# Altium schematic symbol library AliPadash.SchLib: 1186 symbols (part 2 of 6)
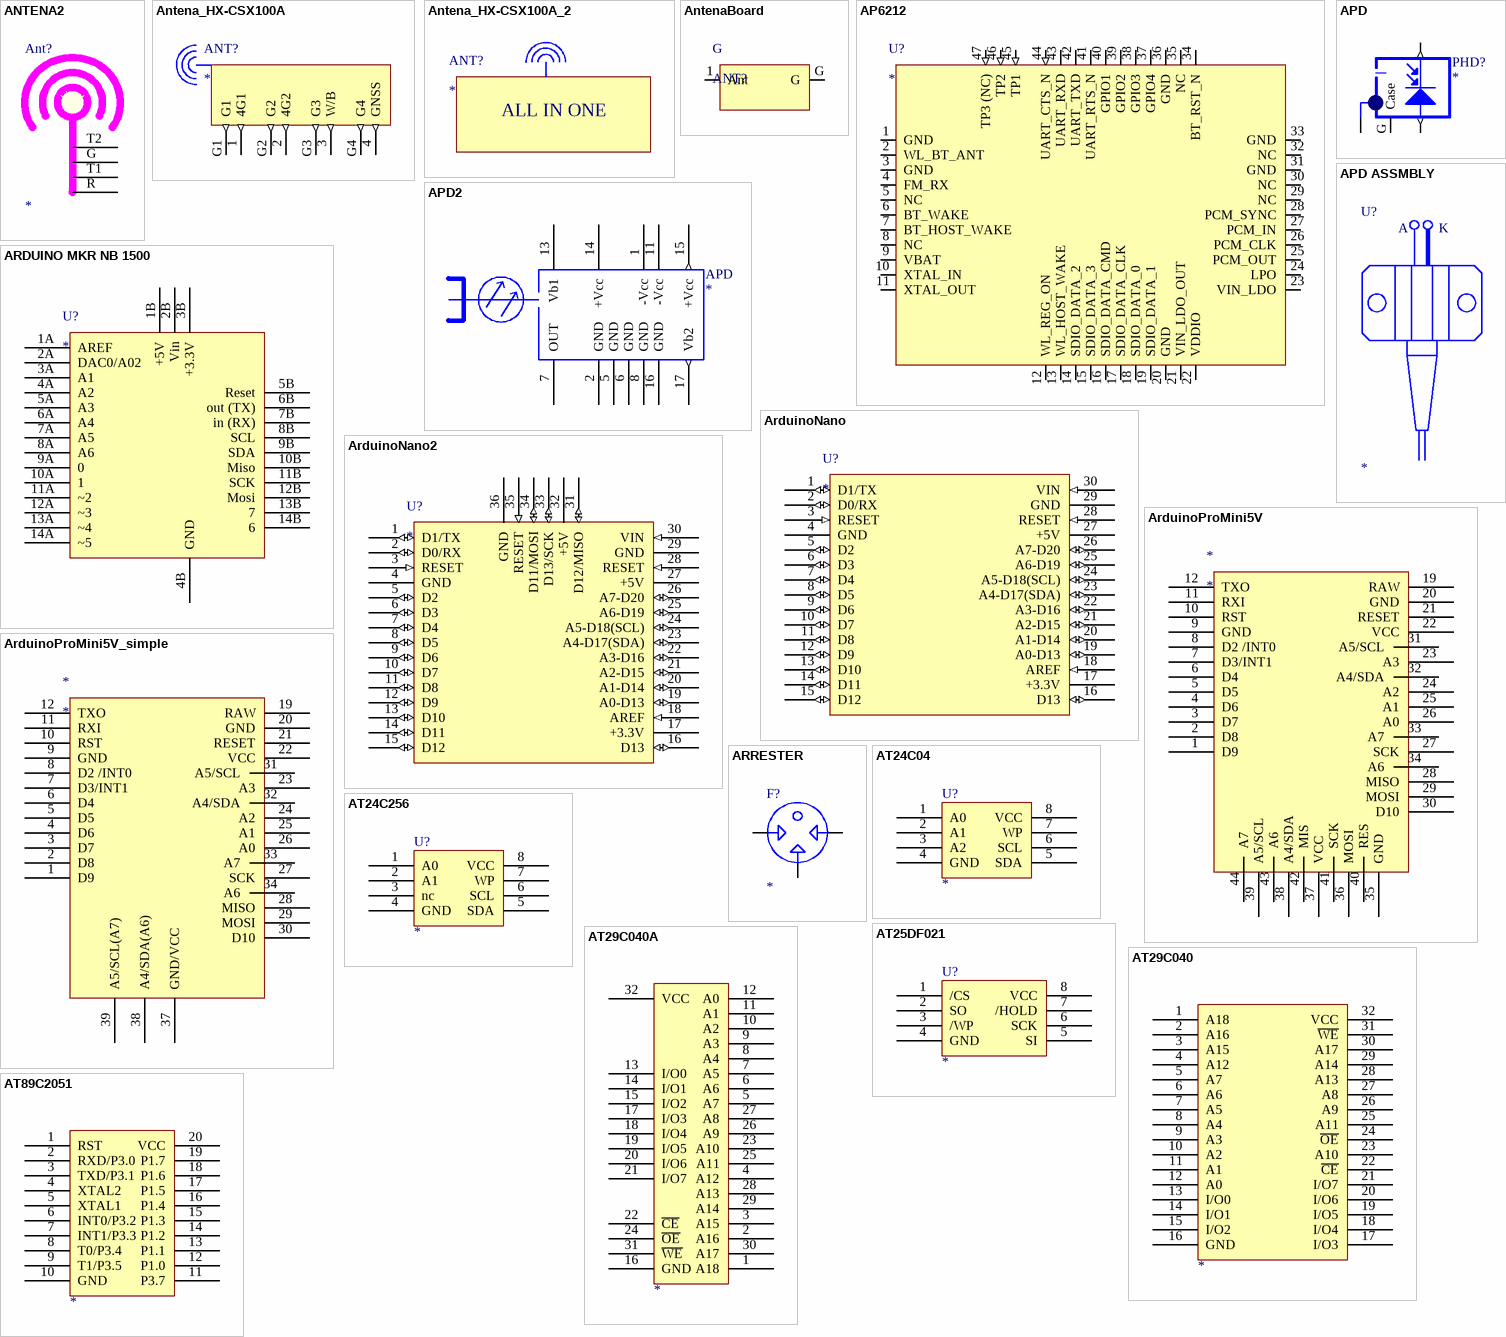
[diagram p87: symbols ANTENA2 to AT89C2051]

## AT29C040A
designator ?
pins: 1 A18, 2 A16, 3 A15, 4 A12, 5 A7, 6 A6, 7 A5, 8 A4, 9 A3, 10 A2, 11 A1, 12 A0, 13 I/O0, 14 I/O1, 15 I/O2, 16 GND, 17 I/O3, 18 I/O4, 19 I/O5, 20 I/O6, 21 I/O7, 22 ~{CE}, 23 A10, 24 ~{OE}, 25 A11, 26 A9, 27 A8, 28 A13, 29 A14, 30 A17, 31 ~{WE}, 32 VCC

## AT89C2051
designator ?
pins: 1 RST, 2 RXD/P3.0, 3 TXD/P3.1, 4 XTAL2, 5 XTAL1, 6 INT0/P3.2, 7 INT1/P3.3, 8 T0/P3.4, 9 T1/P3.5, 10 GND, 11 P3.7, 12 P1.0, 13 P1.1, 14 P1.2, 15 P1.3, 16 P1.4, 17 P1.5, 18 P1.6, 19 P1.7, 20 VCC

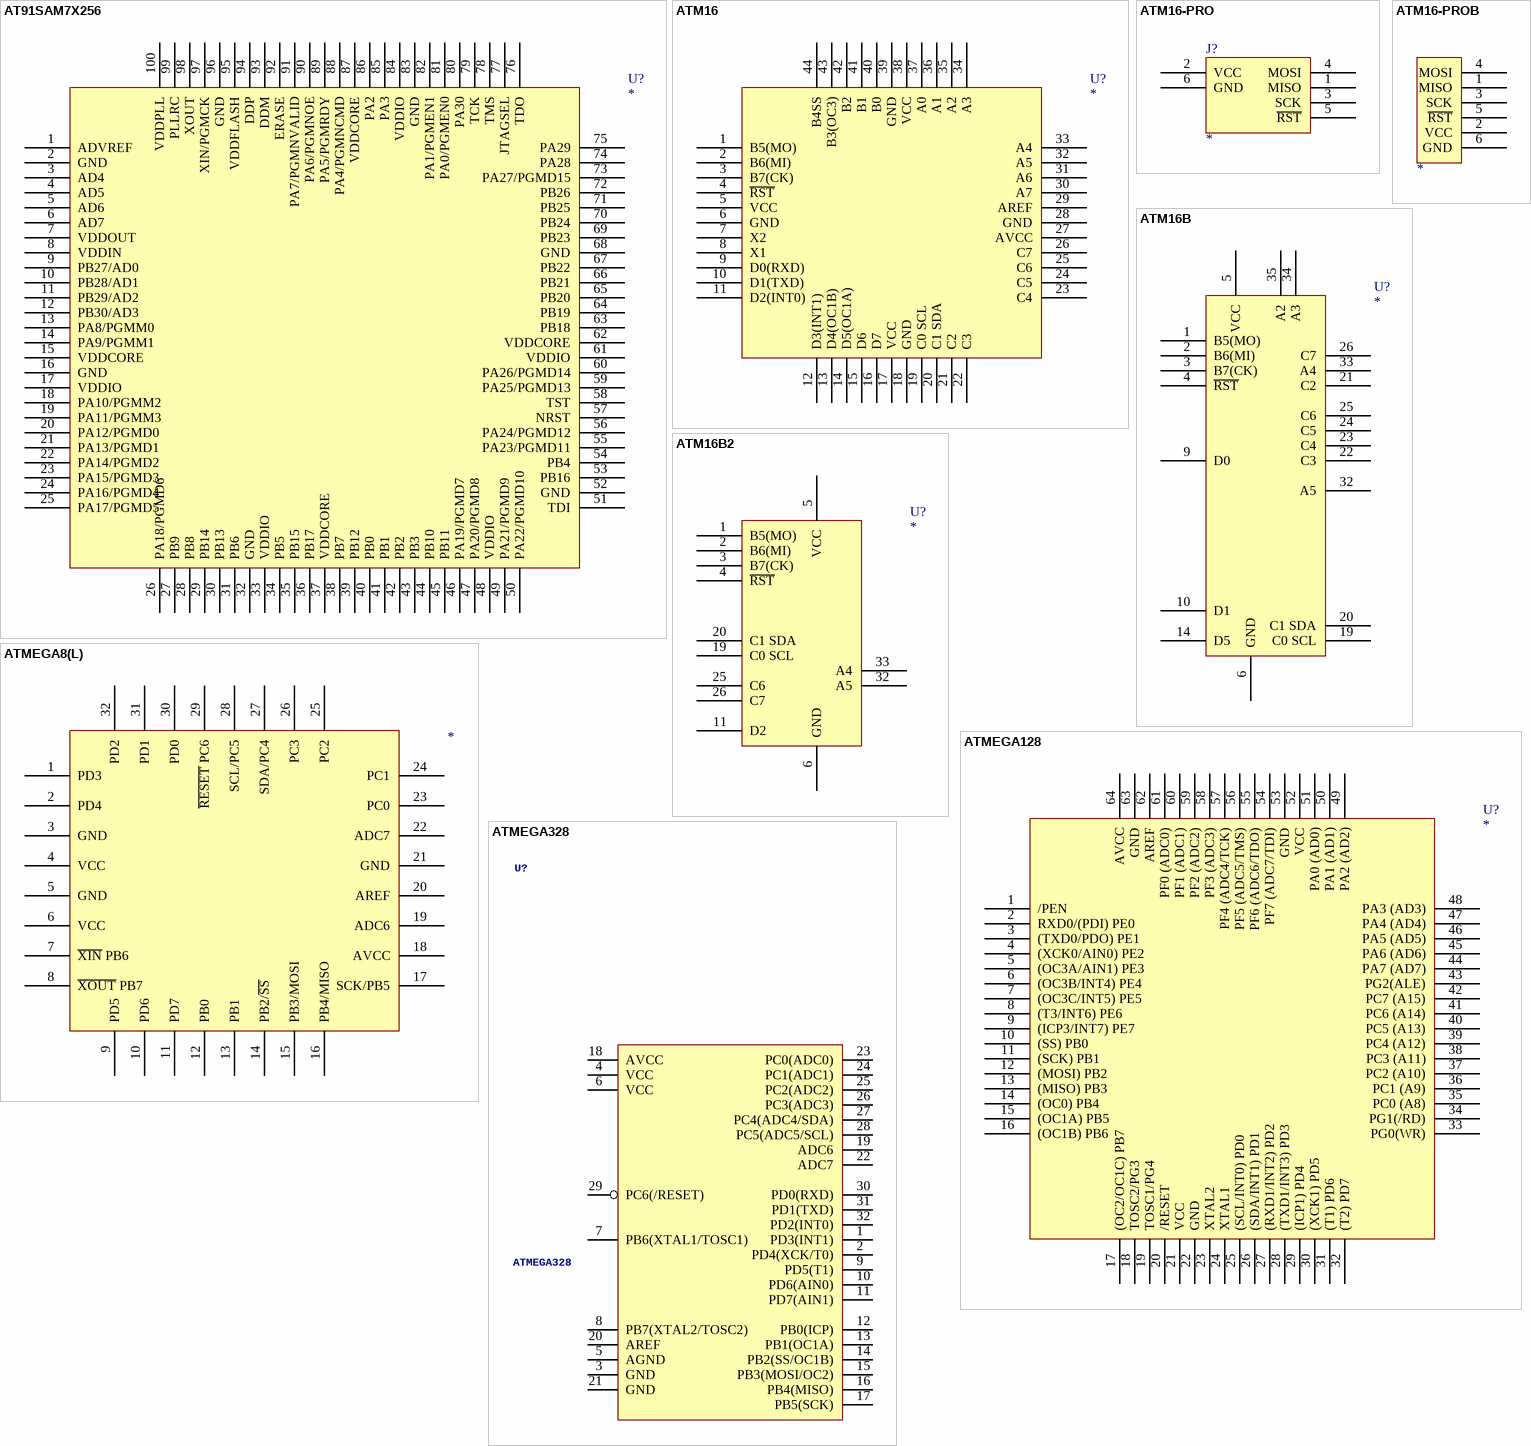
[diagram p15: symbols AT91SAM7X256 to ATMEGA328]

## AT91SAM7X256
designator U?
pins: 1 ADVREF, 2 GND, 3 AD4, 4 AD5, 5 AD6, 6 AD7, 7 VDDOUT, 8 VDDIN, 9 PB27/AD0, 10 PB28/AD1, 11 PB29/AD2, 12 PB30/AD3, 13 PA8/PGMM0, 14 PA9/PGMM1, 15 VDDCORE, 16 GND, 17 VDDIO, 18 PA10/PGMM2, 19 PA11/PGMM3, 20 PA12/PGMD0, 21 PA13/PGMD1, 22 PA14/PGMD2, 23 PA15/PGMD3, 24 PA16/PGMD4, 25 PA17/PGMD5, 26 PA18/PGMD6, 27 PB9, 28 PB8, 29 PB14, 30 PB13, 31 PB6, 32 GND, 33 VDDIO, 34 PB5, 35 PB15, 36 PB17, 37 VDDCORE, 38 PB7, 39 PB12, 40 PB0, 41 PB1, 42 PB2, 43 PB3, 44 PB10, 45 PB11, 46 PA19/PGMD7, 47 PA20/PGMD8, 48 VDDIO, 49 PA21/PGMD9, 50 PA22/PGMD10, 51 TDI, 52 GND, 53 PB16, 54 PB4, 55 PA23/PGMD11, 56 PA24/PGMD12, 57 NRST, 58 TST, 59 PA25/PGMD13, 60 PA26/PGMD14, 61 VDDIO, 62 VDDCORE, 63 PB18, 64 PB19, 65 PB20, 66 PB21, 67 PB22, 68 GND, 69 PB23, 70 PB24, 71 PB25, 72 PB26, 73 PA27/PGMD15, 74 PA28, 75 PA29, 76 TDO, 77 JTAGSEL, 78 TMS, 79 TCK, 80 PA30, 81 PA0/PGMEN0, 82 PA1/PGMEN1, 83 GND, 84 VDDIO, 85 PA3, 86 PA2, 87 VDDCORE, 88 PA4/PGMNCMD, 89 PA5/PGMRDY, 90 PA6/PGMNOE, 91 PA7/PGMNVALID, 92 ERASE, 93 DDM, 94 DDP, 95 VDDFLASH, 96 GND, 97 XIN/PGMCK, 98 XOUT, 99 PLLRC, 100 VDDPLL

## ATM16
designator U?
footprint TQFP44
pins: 1 B5(MO), 2 B6(MI), 3 B7(CK), 4 ~{RST}, 5 VCC, 6 GND, 7 X2, 8 X1, 9 D0(RXD), 10 D1(TXD), 11 D2(INT0), 12 D3(INT1), 13 D4(OC1B), 14 D5(OC1A), 15 D6, 16 D7, 17 VCC, 18 GND, 19 C0 SCL, 20 C1 SDA, 21 C2, 22 C3, 23 C4, 24 C5, 25 C6, 26 C7, 27 AVCC, 28 GND, 29 AREF, 30 A7, 31 A6, 32 A5, 33 A4, 34 A3, 35 A2, 36 A1, 37 A0, 38 VCC, 39 GND, 40 B0, 41 B1, 42 B2, 43 B3(OC3), 44 B4SS

## ATM16-PRO
designator J?
footprint CON6/CON
pins: 1 MISO, 2 VCC, 3 SCK, 4 MOSI, 5 ~{RST}, 6 GND

## ATM16-PROB
designator ?
pins: 1 MISO, 2 VCC, 3 SCK, 4 MOSI, 5 ~{RST}, 6 GND

## ATM16B
designator U?
footprint 44A
pins: 1 B5(MO), 2 B6(MI), 3 B7(CK), 4 ~{RST}, 5 VCC, 6 GND, 9 D0, 10 D1, 14 D5, 19 C0 SCL, 20 C1 SDA, 21 C2, 22 C3, 23 C4, 24 C5, 25 C6, 26 C7, 32 A5, 33 A4, 34 A3, 35 A2

## ATM16B2
designator U?
footprint 44A
pins: 1 B5(MO), 2 B6(MI), 3 B7(CK), 4 ~{RST}, 5 VCC, 6 GND, 11 D2, 19 C0 SCL, 20 C1 SDA, 25 C6, 26 C7, 32 A5, 33 A4

## ATMEGA8(L)
designator ?
U?
footprint TQFP32
pins: 1 PD3, 2 PD4, 3 GND, 4 VCC, 5 GND, 6 VCC, 7 ~{XIN} PB6, 8 ~{XOUT} PB7, 9 PD5, 10 PD6, 11 PD7, 12 PB0, 13 PB1, 14 PB2/~{SS}, 15 PB3/MOSI, 16 PB4/MISO, 17 SCK/PB5, 18 AVCC, 19 ADC6, 20 AREF, 21 GND, 22 ADC7, 23 PC0, 24 PC1, 25 PC2, 26 PC3, 27 SDA/PC4, 28 SCL/PC5, 29 ~{RESET} PC6, 30 PD0, 31 PD1, 32 PD2

## ATMEGA128
designator U?
footprint 64A
pins: 1 /PEN, 2 RXD0/(PDI) PE0, 3 (TXD0/PDO) PE1, 4 (XCK0/AIN0) PE2, 5 (OC3A/AIN1) PE3, 6 (OC3B/INT4) PE4, 7 (OC3C/INT5) PE5, 8 (T3/INT6) PE6, 9 (ICP3/INT7) PE7, 10 (SS) PB0, 11 (SCK) PB1, 12 (MOSI) PB2, 13 (MISO) PB3, 14 (OC0) PB4, 15 (OC1A) PB5, 16 (OC1B) PB6, 17 (OC2/OC1C) PB7, 18 TOSC2/PG3, 19 TOSC1/PG4, 20 /RESET, 21 VCC, 22 GND, 23 XTAL2, 24 XTAL1, 25 (SCL/INT0) PD0, 26 (SDA/INT1) PD1, 27 (RXD1/INT2) PD2, 28 (TXD1/INT3) PD3, 29 (ICP1) PD4, 30 (XCK1) PD5, 31 (T1) PD6, 32 (T2) PD7, 33 PG0(WR), 34 PG1(/RD), 35 PC0 (A8), 36 PC1 (A9), 37 PC2 (A10), 38 PC3 (A11), 39 PC4 (A12), 40 PC5 (A13), 41 PC6 (A14), 42 PC7 (A15), 43 PG2(ALE), 44 PA7 (AD7), 45 PA6 (AD6), 46 PA5 (AD5), 47 PA4 (AD4), 48 PA3 (AD3), 49 PA2 (AD2), 50 PA1 (AD1), 51 PA0 (AD0), 52 VCC, 53 GND, 54 PF7 (ADC7/TDI), 55 PF6 (ADC6/TDO), 56 PF5 (ADC5/TMS), 57 PF4 (ADC4/TCK), 58 PF3 (ADC3), 59 PF2 (ADC2), 60 PF1 (ADC1), 61 PF0 (ADC0), 62 AREF, 63 GND, 64 AVCC

## ATMEGA328
designator U?
footprint TQFP32-08
pins: 1 PD3(INT1), 2 PD4(XCK/T0), 3 GND, 4 VCC, 5 AGND, 6 VCC, 7 PB6(XTAL1/TOSC1), 8 PB7(XTAL2/TOSC2), 9 PD5(T1), 10 PD6(AIN0), 11 PD7(AIN1), 12 PB0(ICP), 13 PB1(OC1A), 14 PB2(SS/OC1B), 15 PB3(MOSI/OC2), 16 PB4(MISO), 17 PB5(SCK), 18 AVCC, 19 ADC6, 20 AREF, 21 GND, 22 ADC7, 23 PC0(ADC0), 24 PC1(ADC1), 25 PC2(ADC2), 26 PC3(ADC3), 27 PC4(ADC4/SDA), 28 PC5(ADC5/SCL), 29 PC6(/RESET), 30 PD0(RXD), 31 PD1(TXD), 32 PD2(INT0)

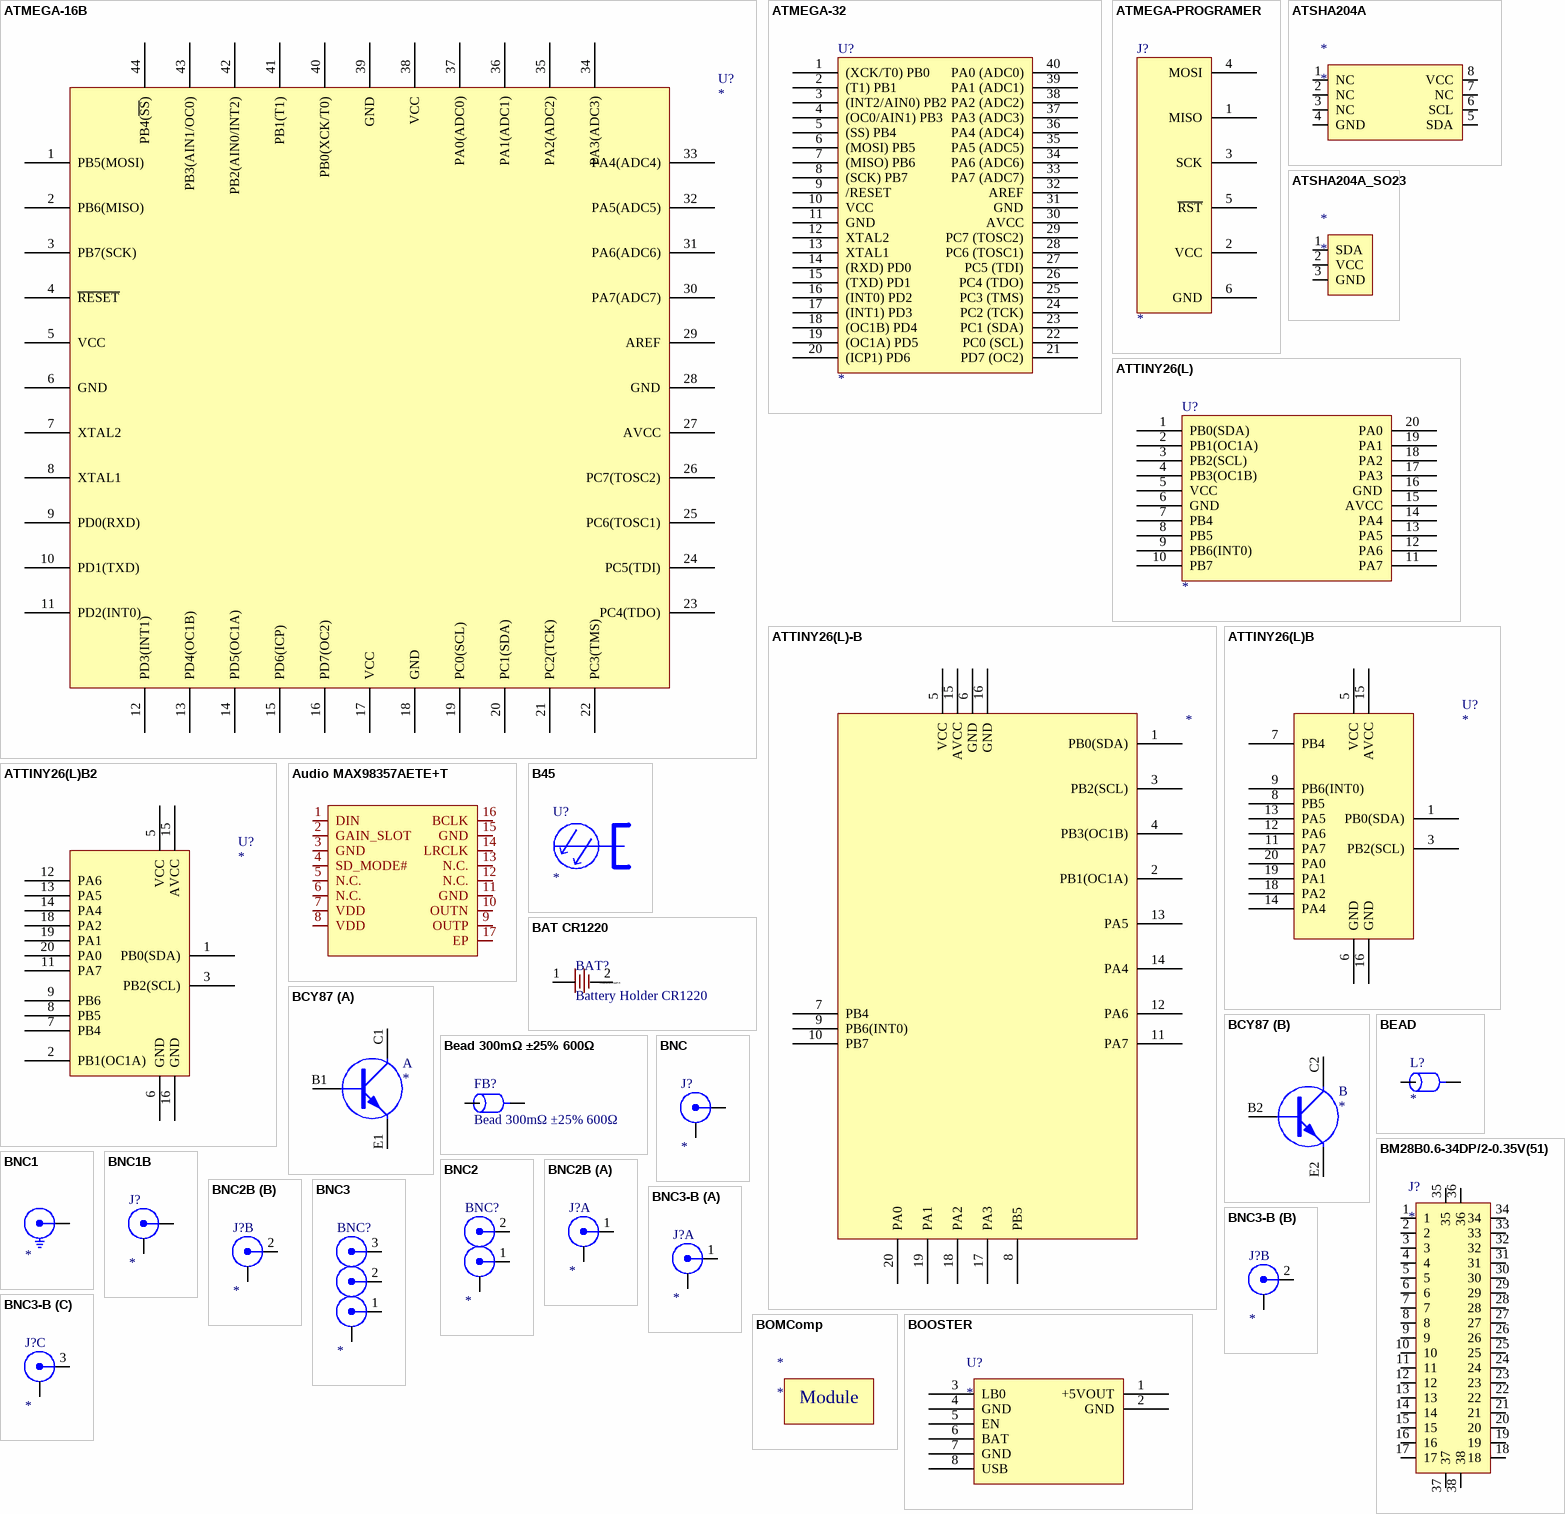
[diagram p16: symbols ATMEGA-16B to BOOSTER]

## ATMEGA-16B
designator U?
footprint TQFP44
pins: 1 PB5(MOSI), 2 PB6(MISO), 3 PB7(SCK), 4 ~{RESET}, 5 VCC, 6 GND, 7 XTAL2, 8 XTAL1, 9 PD0(RXD), 10 PD1(TXD), 11 PD2(INT0), 12 PD3(INT1), 13 PD4(OC1B), 14 PD5(OC1A), 15 PD6(ICP), 16 PD7(OC2), 17 VCC, 18 GND, 19 PC0(SCL), 20 PC1(SDA), 21 PC2(TCK), 22 PC3(TMS), 23 PC4(TDO), 24 PC5(TDI), 25 PC6(TOSC1), 26 PC7(TOSC2), 27 AVCC, 28 GND, 29 AREF, 30 PA7(ADC7), 31 PA6(ADC6), 32 PA5(ADC5), 33 PA4(ADC4), 34 PA3(ADC3), 35 PA2(ADC2), 36 PA1(ADC1), 37 PA0(ADC0), 38 VCC, 39 GND, 40 PB0(XCK/T0), 41 PB1(T1), 42 PB2(AIN0/INT2), 43 PB3(AIN1/OC0), 44 PB4(~{SS})

## ATMEGA-32
designator U?
footprint DIP40
pins: 1 (XCK/T0) PB0, 2 (T1) PB1, 3 (INT2/AIN0) PB2, 4 (OC0/AIN1) PB3, 5 (SS) PB4, 6 (MOSI) PB5, 7 (MISO) PB6, 8 (SCK) PB7, 9 /RESET, 10 VCC, 11 GND, 12 XTAL2, 13 XTAL1, 14 (RXD) PD0, 15 (TXD) PD1, 16 (INT0) PD2, 17 (INT1) PD3, 18 (OC1B) PD4, 19 (OC1A) PD5, 20 (ICP1) PD6, 21 PD7 (OC2), 22 PC0 (SCL), 23 PC1 (SDA), 24 PC2 (TCK), 25 PC3 (TMS), 26 PC4 (TDO), 27 PC5 (TDI), 28 PC6 (TOSC1), 29 PC7 (TOSC2), 30 AVCC, 31 GND, 32 AREF, 33 PA7 (ADC7), 34 PA6 (ADC6), 35 PA5 (ADC5), 36 PA4 (ADC4), 37 PA3 (ADC3), 38 PA2 (ADC2), 39 PA1 (ADC1), 40 PA0 (ADC0)

## ATMEGA-PROGRAMER
designator J?
footprint CON6/CON
pins: 1 MISO, 2 VCC, 3 SCK, 4 MOSI, 5 ~{RST}, 6 GND

## ATSHA204A
designator *
footprint UDFN-8 (SON, 8-Leads, Body 3.00x2.00mm, Pitch 0.50mm, IPC Medium Density)
pins: 1 NC, 2 NC, 3 NC, 4 GND, 5 SDA, 6 SCL, 7 NC, 8 VCC

## ATSHA204A_SO23
designator *
footprint SOT-23
pins: 1 SDA, 2 VCC, 3 GND

## ATTINY26(L)
designator U?
footprint DIP20
pins: 1 PB0(SDA), 2 PB1(OC1A), 3 PB2(SCL), 4 PB3(OC1B), 5 VCC, 6 GND, 7 PB4, 8 PB5, 9 PB6(INT0), 10 PB7, 11 PA7, 12 PA6, 13 PA5, 14 PA4, 15 AVCC, 16 GND, 17 PA3, 18 PA2, 19 PA1, 20 PA0

## ATTINY26(L)-B
designator ?
pins: 1 PB0(SDA), 2 PB1(OC1A), 3 PB2(SCL), 4 PB3(OC1B), 5 VCC, 6 GND, 7 PB4, 8 PB5, 9 PB6(INT0), 10 PB7, 11 PA7, 12 PA6, 13 PA5, 14 PA4, 15 AVCC, 16 GND, 17 PA3, 18 PA2, 19 PA1, 20 PA0

## ATTINY26(L)B
designator U?
footprint DIP20
pins: 1 PB0(SDA), 3 PB2(SCL), 5 VCC, 6 GND, 7 PB4, 8 PB5, 9 PB6(INT0), 11 PA7, 12 PA6, 13 PA5, 14 PA4, 15 AVCC, 16 GND, 18 PA2, 19 PA1, 20 PA0

## ATTINY26(L)B2
designator U?
footprint DIP20
pins: 1 PB0(SDA), 2 PB1(OC1A), 3 PB2(SCL), 5 VCC, 6 GND, 7 PB4, 8 PB5, 9 PB6, 11 PA7, 12 PA6, 13 PA5, 14 PA4, 15 AVCC, 16 GND, 18 PA2, 19 PA1, 20 PA0

## Audio MAX98357AETE+T
designator U?, comment MAX98357AETE+T  (value not drawn)
JLC: C910544; MFAC: MAX98357AETE+T
footprint TQFN-16_L3.0-W3.0-P0.50-BL-EP1.5
pins: 1 DIN, 2 GAIN_SLOT, 3 GND, 4 SD_MODE#, 5 N.C., 6 N.C., 7 VDD, 8 VDD, 9 OUTP, 10 OUTN, 11 GND, 12 N.C., 13 N.C., 14 LRCLK, 15 GND, 16 BCLK, 17 EP

## B45
designator U?

## BAT CR1220
designator BAT?, comment Battery Holder CR1220
MFAC: CR1220-2; JLC: C70381
footprint BAT_HOLDER_CR1220 (Footprint not found)
pins: 1, 2
text: Telegram @DesignPCB

## BCY87
designator ?
part A pins: B1 B, C1 C, E1 E
part B pins: B2 B, C2 C, E2 E

## BEAD
designator L?
footprint BEAD
pins: 1, 2

## Bead 300mΩ ±25% 600Ω
designator FB?
MFAC: GZ2012D601TF; JLC: C1017
footprint 0805
footprint 0805
pins: 1, 2

## BM28B0.6-34DP/2-0.35V(51)
designator J?
footprint BM28B0.6-34DP/2-0.35V(51) (Footprint not found)
pins: 1, 2, 3, 4, 5, 6, 7, 8, 9, 10, 11, 12, 13, 14, 15, 16, 17, 18, 19, 20, 21, 22, 23, 24, 25, 26, 27, 28, 29, 30, 31, 32, 33, 34, 35, 36, 37, 38

## BNC
designator J?
footprint ufl
pins: 1, 2

## BNC1
designator ?
pins: 1, G GND hidden to GND

## BNC1B
designator J?
footprint BNC1-CANARE
pins: 1, G

## BNC2
designator BNC?
footprint BNC2-CANARE
pins: 1, 2, G

## BNC2B
designator J?
footprint BNC2-CANARE
part A pins: 1, G
part B pins: 2, G

## BNC3
designator BNC?
footprint BNC3-CANARE
pins: 1, 2, 3, G

## BNC3-B
designator J?
footprint BNC3-CANARE
part A pins: 1, G
part B pins: 2, G
part C pins: 3, G

## BOMComp
designator *
text: Module

## BOOSTER
designator U?
footprint booster
pins: 1 +5VOUT, 2 GND, 3 LB0, 4 GND, 5 EN, 6 BAT, 7 GND, 8 USB

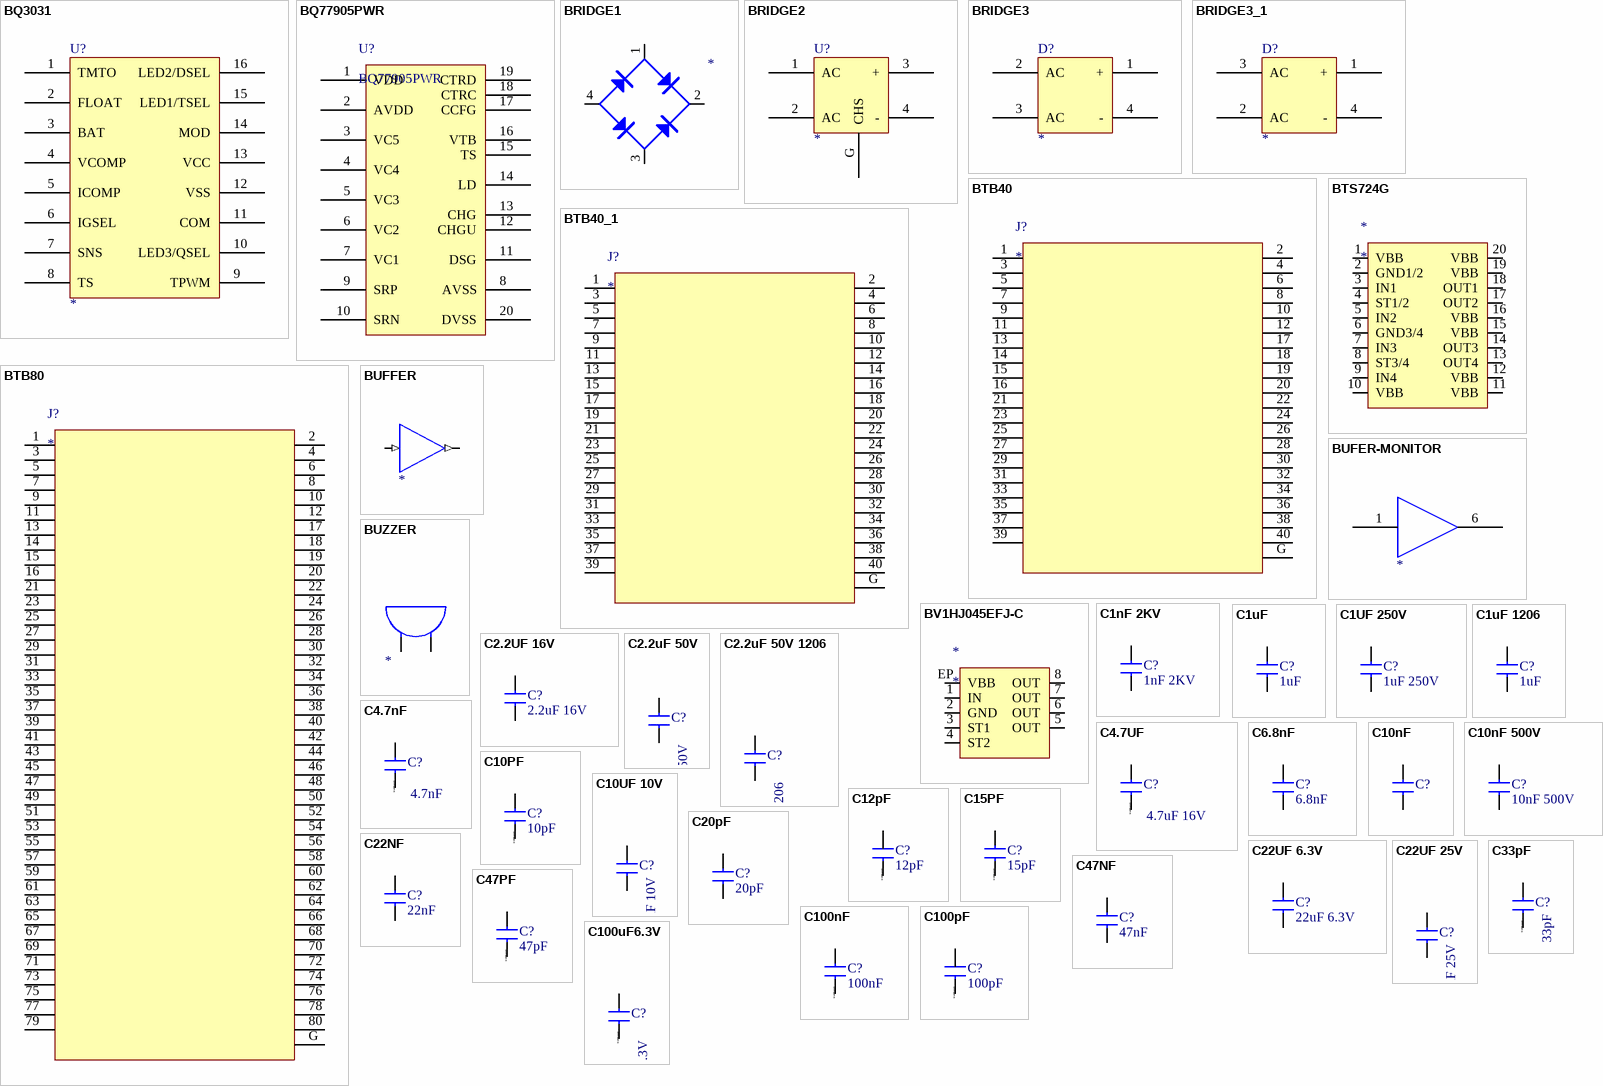
[diagram p17: symbols BQ3031 to C100uF6.3V]

## BQ3031
designator U?
footprint DIP16
footprint SO-16
pins: 1 TMTO, 2 FLOAT, 3 BAT, 4 VCOMP, 5 ICOMP, 6 IGSEL, 7 SNS, 8 TS, 9 TPWM, 10 LED3/QSEL, 11 COM, 12 VSS, 13 VCC, 14 MOD, 15 LED1/TSEL, 16 LED2/DSEL

## BQ77905PWR
designator U?
pins: 1 VDD, 2 AVDD, 3 VC5, 4 VC4, 5 VC3, 6 VC2, 7 VC1, 8 AVSS, 9 SRP, 10 SRN, 11 DSG, 12 CHGU, 13 CHG, 14 LD, 15 TS, 16 VTB, 17 CCFG, 18 CTRC, 19 CTRD, 20 DVSS

## BRIDGE1
designator ?
JLC: *; MFAC: *
pins: 1, 2, 3, 4

## BRIDGE2
designator U?
footprint BRIDGE
pins: 1 AC, 2 AC, 3 +, 4 -, G CHS

## BRIDGE3
designator D?
footprint BRG-1
pins: 1 +, 2 AC, 3 AC, 4 -

## BRIDGE3_1
designator D?
footprint BRG-1
pins: 1 +, 2 AC, 3 AC, 4 -

## BTB40
designator J?
footprint BTB2X40 (SON, 80-Leads, Body 36/20x6/00mm, Pitch 0/80mm, IPC Medium Density)
pins: 1  , 2  , 3  , 4  , 5  , 6  , 7  , 8  , 9  , 10  , 11  , 12  , 13  , 14  , 15  , 16  , 17  , 18  , 19  , 20  , 21  , 22  , 23  , 24  , 25  , 26  , 27  , 28  , 29  , 30  , 31  , 32  , 33  , 34  , 35  , 36  , 37  , 38  , 39  , 40  , G  

## BTB40_1
designator J?
footprint BTB2X40 (SON, 80-Leads, Body 36/20x6/00mm, Pitch 0/80mm, IPC Medium Density)
pins: 1  , 2  , 3  , 4  , 5  , 6  , 7  , 8  , 9  , 10  , 11  , 12  , 13  , 14  , 15  , 16  , 17  , 18  , 19  , 20  , 21  , 22  , 23  , 24  , 25  , 26  , 27  , 28  , 29  , 30  , 31  , 32  , 33  , 34  , 35  , 36  , 37  , 38  , 39  , 40  , G  

## BTB80
designator J?
footprint BTB2X40 (SON, 80-Leads, Body 36/20x6/00mm, Pitch 0/80mm, IPC Medium Density)
pins: 1  , 2  , 3  , 4  , 5  , 6  , 7  , 8  , 9  , 10  , 11  , 12  , 13  , 14  , 15  , 16  , 17  , 18  , 19  , 20  , 21  , 22  , 23  , 24  , 25  , 26  , 27  , 28  , 29  , 30  , 31  , 32  , 33  , 34  , 35  , 36  , 37  , 38  , 39  , 40  , 41  , 42  , 43  , 44  , 45  , 46  , 47  , 48  , 49  , 50  , 51  , 52  , 53  , 54  , 55  , 56  , 57  , 58  , 59  , 60  , 61  , 62  , 63  , 64  , 65  , 66  , 67  , 68  , 69  , 70  , 71  , 72  , 73  , 74  , 75  , 76  , 77  , 78  , 79  , 80  , G  

## BTS724G
designator *
footprint SO-20WB
pins: 1 VBB, 2 GND1/2, 3 IN1, 4 ST1/2, 5 IN2, 6 GND3/4, 7 IN3, 8 ST3/4, 9 IN4, 10 VBB, 11 VBB, 12 VBB, 13 OUT4, 14 OUT3, 15 VBB, 16 VBB, 17 OUT2, 18 OUT1, 19 VBB, 20 VBB

## BUFER-MONITOR
designator ?
pins: 1, 2 +12V hidden to +12V, 3 GND hidden to GND, 4 +12V hidden to +12V, 5 GND hidden to GND, 6

## BUFFER
designator ?
pins: 1 (in), 2 (out)

## BUZZER
designator ?
pins: 1, 2

## BV1HJ045EFJ-C
designator *
footprint SO-8-EP
pins: 1 IN, 2 GND, 3 ST1, 4 ST2, 5 OUT, 6 OUT, 7 OUT, 8 OUT, EP VBB

## C1nF 2KV
designator C?, comment 1nF 2KV
MFAC: 1206B102K202NT; JLC: C9196
footprint 0805
footprint CAP0.4
footprint 0402
footprint RAD0.
footprint 1206
footprint 0603
pins: 1, 2

## C1uF
designator C?, comment 1uF
MFAC: CL10A105KB8NNNC; JLC: C15849
footprint 0805
footprint CAP0.4
footprint 0402
footprint RAD0.
footprint 0603
footprint 0603
footprint 0603
footprint 0603
pins: 1, 2

## C1UF 250V
designator C?, comment 1uF 250V
MFAC: FS43X105K251EGG; JLC: C381468
footprint 1812
footprint CAP0.4
footprint 0402
footprint RAD0.
pins: 1, 2

## C1uF 1206
designator C?, comment 1uF
MFAC: CL31B105KBHNNNE; JLC: C1848
footprint 0805
footprint CAP0.4
footprint 0402
footprint RAD0.
footprint 0603
footprint 0603
footprint 1206
footprint 0603
pins: 1, 2

## C2.2UF 16V
designator C?, comment 2.2uF 16V
MFAC: CL10A225KO8NNNC; JLC: C23630
footprint 0805
footprint CAP0.4
footprint 0402
footprint RAD0.
footprint 0603
pins: 1, 2

## C2.2uF 50V
designator C?, comment 2.2uF 50V
MFAC: CL21A225KBQNNNE; JLC: C377773
footprint 0805
footprint CAP0.4
footprint 0402
footprint RAD0.
pins: 1, 2

## C2.2uF 50V 1206
designator C?, comment 2.2uF 50V 1206
MFAC: CL31B225KBHNNNE; JLC: C50254
footprint 1206
footprint CAP0.4
footprint 0402
footprint RAD0.
pins: 1, 2

## C4.7nF
designator C?, comment 4.7nF
MFAC: 0603B472K500NT; JLC: C53987
footprint 0805
footprint CAP0.4
footprint 0402
footprint RAD0.
footprint 0603
pins: 1, 2
text: @DesignPCB

## C4.7UF
designator C?, comment 4.7uF 16V
MFAC: CL10A475KO8NNNC; JLC: C19666
footprint 0805
footprint CAP0.4
footprint 0402
footprint RAD0.
footprint 0603
pins: 1, 2
text: @DesignPCB

## C6.8nF
designator C?, comment 6.8nF
MFAC: 0603B682K500NT; JLC: C1631
footprint 0603
footprint CAP0.4
footprint 0402
footprint RAD0.
footprint 0603
footprint 0603
pins: 1, 2

## C10nF
designator C?
MFAC: 0603B103K500NT; JLC: C57112
footprint 0603
footprint CAP0.4
footprint 0402
footprint RAD0.
footprint 0603
footprint 0603
pins: 1, 2

## C10nF 500V
designator C?, comment 10nF 500V
MFAC: CC0805KKX7RBBB103; JLC: C106840
footprint 0603
footprint CAP0.4
footprint 0402
footprint RAD0.
footprint 0805
footprint 0603
pins: 1, 2

## C10PF
designator C?, comment 10pF
MFAC: CL10C100JB8NNNC; JLC: C1634
footprint 0402
footprint CAP0.4
footprint 0402
footprint RAD0.
footprint 0402
footprint 0603
footprint 0603
pins: 1, 2
text: @DesignPCB

## C10UF 10V
designator C?, comment 10uF 10V
MFAC: CL10A106KP8NNNC; JLC: C19702
footprint 0805
footprint CAP0.4
footprint 0402
footprint RAD0.
footprint 0603
pins: 1, 2

## C12pF
designator C?, comment 12pF
MFAC: CL10C120JB8NNNC; JLC: C38523
footprint 0805
footprint CAP0.4
footprint 0402
footprint RAD0.
footprint 0603
footprint 0603
pins: 1, 2
text: @DesignPCB

## C15PF
designator C?, comment 15pF
MFAC: CL10C150JB8NNNC; JLC: C1644
footprint 0402
footprint CAP0.4
footprint 0402
footprint RAD0.
footprint 0402
footprint 0603
footprint 0603
pins: 1, 2
text: @DesignPCB

## C20pF
designator C?, comment 20pF
MFAC: CL10C200JB8NNNC; JLC: C1648
footprint 0603
footprint CAP0.4
footprint 0402
footprint RAD0.
footprint 0603
footprint 0603
footprint 0603
pins: 1, 2

## C22NF
designator C?, comment 22nF
MFAC: CL10B223KB8NNNC; JLC: C21122
footprint 0805
footprint CAP0.4
footprint 0402
footprint RAD0.
footprint 0603
footprint 0603
pins: 1, 2

## C22UF 6.3V
designator C?, comment 22uF 6.3V
MFAC: CL10A226MQ8NRNC; JLC: C59461
footprint 0603
footprint CAP0.4
footprint 0402
footprint RAD0.
footprint 0603
footprint 0805
pins: 1, 2

## C22UF 25V
designator C?, comment 22uF 25V
MFAC: CL21A226MAQNNNE; JLC: C45783
footprint 0805
footprint CAP0.4
footprint 0402
footprint RAD0.
footprint 0805
pins: 1, 2

## C33pF
designator C?, comment 33pF
MFAC: CL10C330JB8NNNC; JLC: C1663
footprint 0805
footprint CAP0.4
footprint 0402
footprint RAD0.
footprint 0603
footprint 0603
pins: 1, 2
text: @DesignPCB

## C47NF
designator C?, comment 47nF
MFAC: CL10B473KB8NNNC; JLC: C1622
footprint 0805
footprint CAP0.4
footprint 0402
footprint RAD0.
footprint 0603
pins: 1, 2

## C47PF
designator C?, comment 47pF
MFAC: CL10C470JB8NNNC; JLC: C1671
footprint 0402
footprint CAP0.4
footprint 0402
footprint RAD0.
footprint 0402
footprint 0603
footprint 0603
pins: 1, 2
text: @DesignPCB

## C100nF
designator C?, comment 100nF
MFAC: CC0603KRX7R9BB104; JLC: C14663
footprint 0603
footprint CAP0.4
footprint 0402
footprint RAD0.
pins: 1, 2
text: @DesignPCB

## C100pF
designator C?, comment 100pF
MFAC: CL10C101JB8NNNC; JLC: C14858
footprint 0805
footprint CAP0.4
footprint 0402
footprint RAD0.
footprint 0603
footprint 0603
pins: 1, 2
text: @DesignPCB

## C100uF6.3V
designator C?, comment 100uF 6.3V
MFAC: CL31A107MQHNNNE; JLC: C15008
footprint 1206
footprint CAP0.4
footprint 0402
footprint RAD0.
pins: 1, 2
text: @DesignPCB

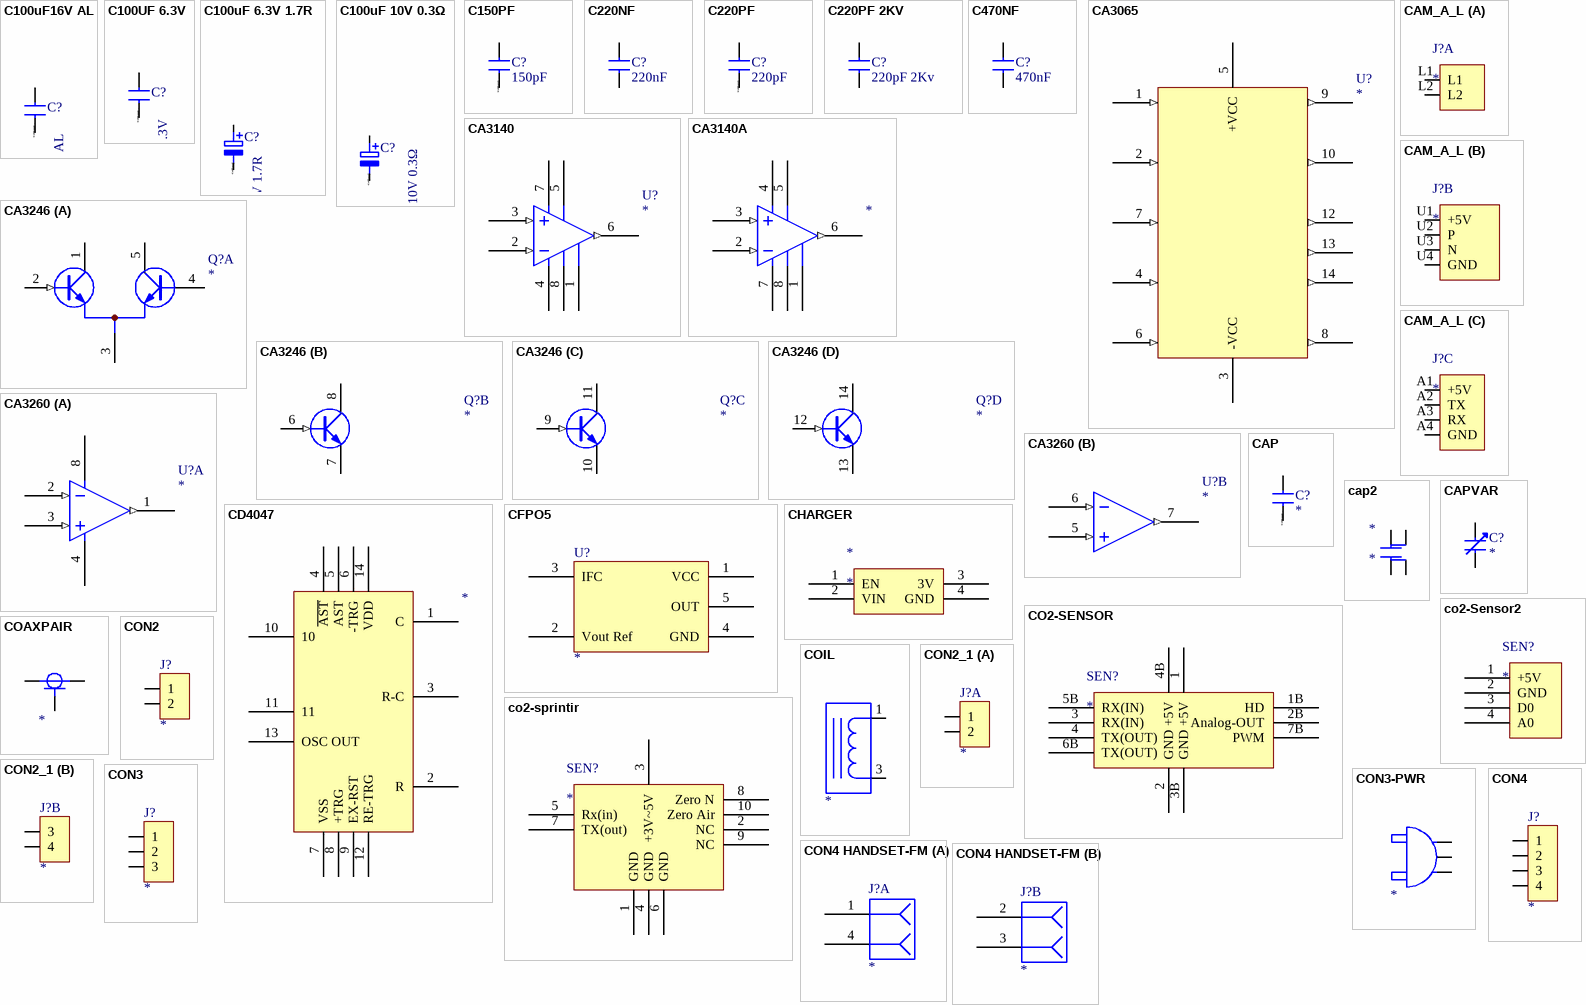
[diagram p18: symbols C100uF16V AL to CON4 HANDSET-FM]

## C100uF16V AL
designator C?, comment 100uF 16V AL
MFAC: CS1C101M-CRE54; JLC: C97805
footprint CAP-SMD_BD6.3-L6.6-W6.6-LS7.2-R-RD
footprint CAP0.4
footprint 0402
footprint RAD0.
pins: 1, 2
text: @DesignPCB

## C100UF 6.3V
designator C?, comment 100uF 6.3V
MFAC: CL31A107MQHNNNE; JLC: C15008
footprint 1206
footprint CAP0.4
footprint 0402
footprint RAD0.
pins: 1, 2
text: @DesignPCB

## C100uF 6.3V 1.7R
designator C?, comment 100uF 6.3V 1.7R
MFAC: TAJB107K006RNJ; JLC: C16133
footprint 3528
footprint RB.1/.2
footprint RB.1/.25
footprint RB.1/.3
pins: 1, 2
text: @DesignPCB
